# Altium footprint library hphonglib.PcbLib: 1250 footprints (part 62 of 79)
Each footprint in its own frame and in the unit in brackets; x right, y up, seen from the top. Pads: shape width x height; smd on the part's side, far side on the other; paste and mask are expansions set on the pad; w line width, h text height; cw(c..) or ccw(c..) is an arc to the next point about the centre after c.
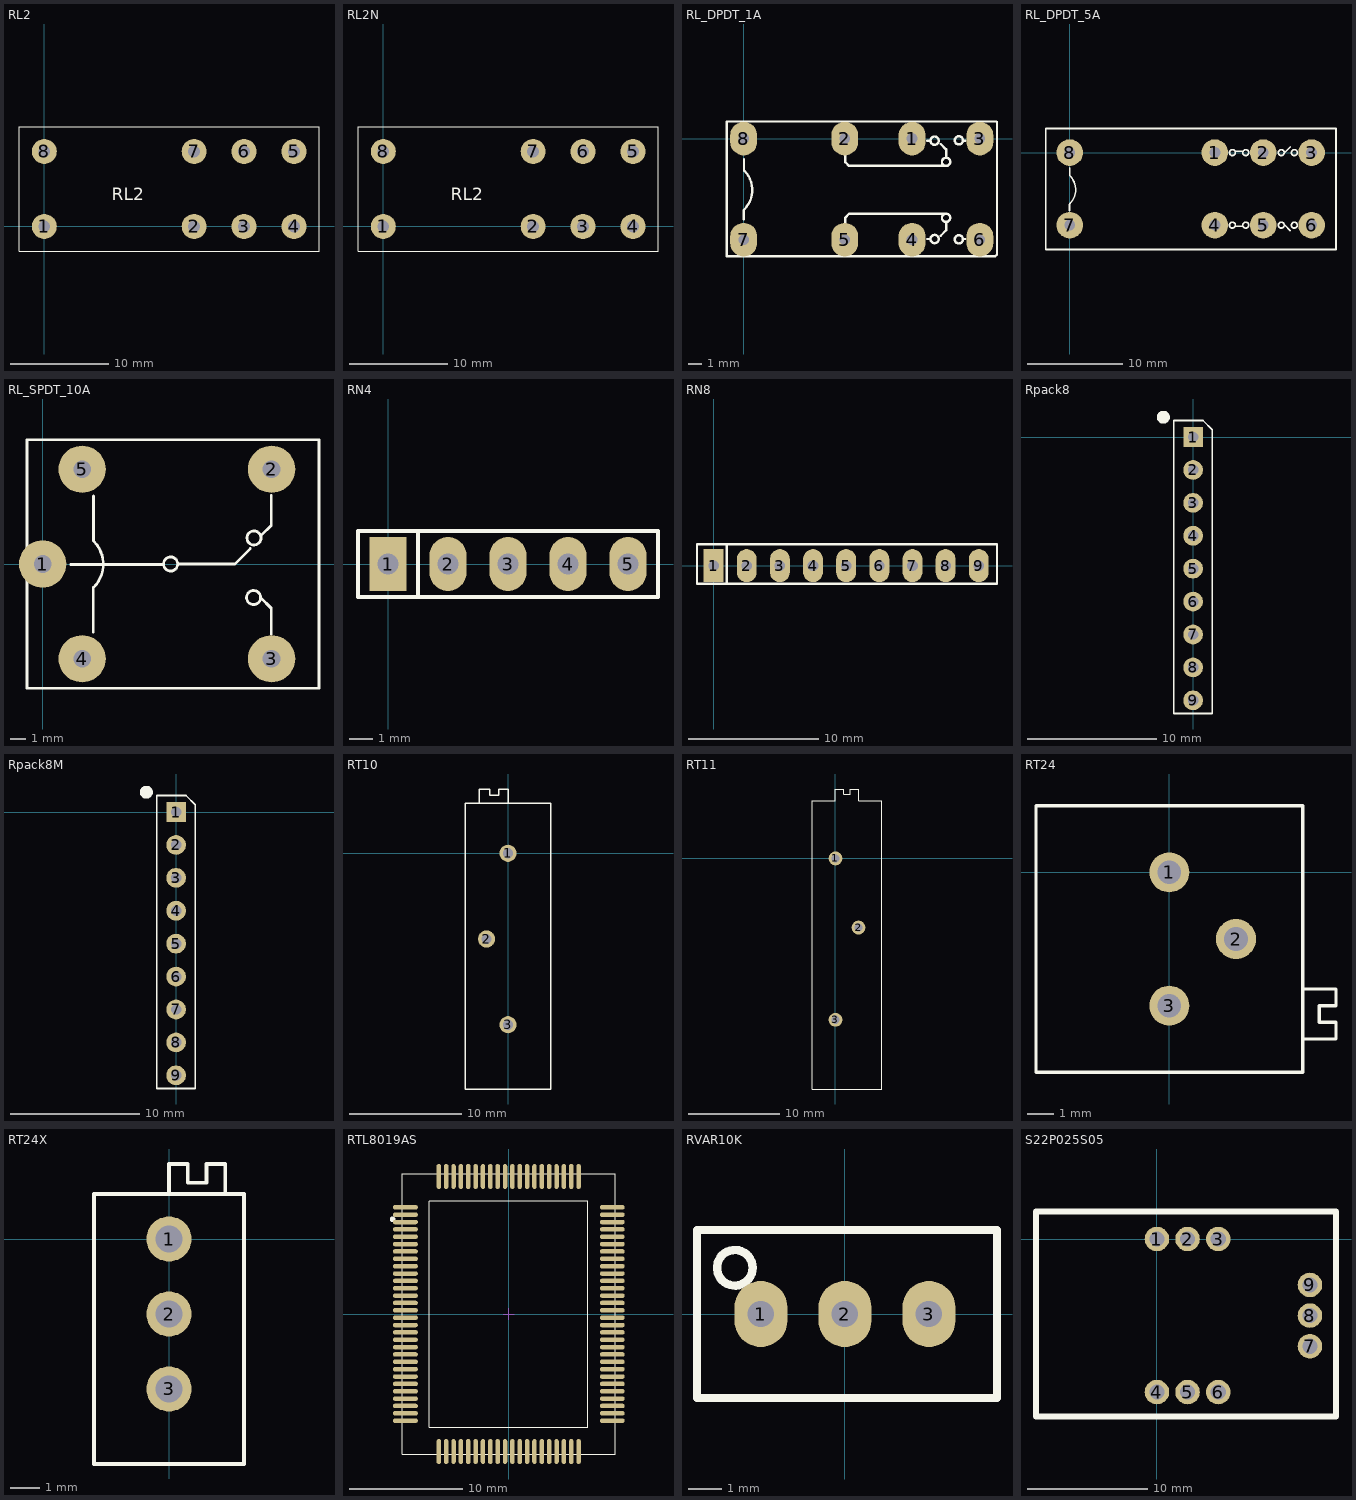
[diagram p61: the footprints below, top view; thin cyan lines are the x and y axes]

## RL2 [mm] "Relè body 29x12mm - 2 way - FEME"
pads (8):
  round 2.54 hole 1.2: 1(0,0) 2(15.24,0) 3(20.32,0) 4(25.4,0) 5(25.4,7.62) 6(20.32,7.62) 7(15.24,7.62) 8(0,7.62)
Top Overlay:
  lines w0.127: -2.54,-2.54 -2.54,10.16 27.94,10.16 27.94,-2.54 -2.54,-2.54
  text "RL2" at 6.858,2.667 h1.27
Bottom Overlay:
  lines w0.254: -2.575,-2.55 27.925,-2.55 27.925,10.125 -2.575,10.125 -2.575,-2.55
3D body: height 22, standoff 0.1, extent -2.45,-2.45 27.9,10.1

## RL2N [mm] "Relè body 29x12mm - 2 way - FEME"
pads (8):
  round 2.54 hole 1.2: 1(0,0) 2(15.24,0) 3(20.32,0) 4(25.4,0) 5(25.4,7.62) 6(20.32,7.62) 7(15.24,7.62) 8(0,7.62)
Top Overlay:
  lines w0.127: -2.54,-2.54 -2.54,10.16 27.94,10.16 27.94,-2.54 -2.54,-2.54
  text "RL2" at 6.858,2.667 h1.27
Bottom Overlay:
  lines w0.254: -2.575,-2.55 27.925,-2.55 27.925,10.125 -2.575,10.125 -2.575,-2.55
3D body "Relay.STEP": height 20.9, standoff -3.99, extent -1.941,-2.465 27.559,10.035

## RL_DPDT_1A [mil] "Reley DPDT, 8 pin, 1A, W400mil, L800mil,H 300mil"
height 300
pads (8):
  oval 80x100 hole 32: 1(500,0) 2(300,0) 3(701,0) 4(500,-300) 5(300,-300) 6(701,-300) 7(0,-300) 8(0,0)
Top Overlay:
  circle w7: c638.76,-299 r12.24
  circle w7: c566.76,-298 r12.24
  circle w7: c600.76,-235 r12.24
  circle w7: c600.76,-69 r12.24
  circle w7: c566.76,-6 r12.24
  circle w7: c638.76,-5 r12.24
  lines w7: 0,-239 0,-212 ; 1,-211 ccw(c-56.5,-152.5) 2,-95 ; 1,-94 1,-61 ; 302,-255 302,-234 313,-223 599,-223 ; 302,-42 302,-70 313,-81 599,-81 ; 544,-298 552,-298 ; 544,-6 552,-6 ; 585,-288 601,-272 601,-249 ; 585,-16 601,-32 601,-55 ; 653,-298 658,-298 ; 653,-6 658,-6 ; -50,-349 -50,51 750,51 752,49 752,-344 747,-349 -50,-349
3D body "SW3dPS-DSY2Y.STEP": height 484.25, standoff -118.11, extent -59.45,-340 759.45,45.83

## RL_DPDT_5A [mil] "Reley DPDT, 8 pin, 5A, W500mil, L1100mil,H 950mil"
height 300
pads (8):
  round 110 hole 45: 1(600,0) 2(800,0) 3(1000,0) 4(600,-300) 5(800,-300) 6(1000,-300) 7(0,-300) 8(0,0)
Top Overlay:
  circle w7: c928.76,-300 r12.24
  circle w7: c874.76,-300 r12.24
  circle w7: c727.76,-300 r12.24
  circle w7: c672.76,-300 r12.24
  circle w7: c672.76,0 r12.24
  circle w7: c727.76,0 r12.24
  circle w7: c874.76,0 r12.24
  circle w7: c928.76,0 r12.24
  lines w7: -1,-240 -1,-213 ; 0,-212 ccw(c-57.5,-153.5) 1,-96 ; 0,-95 0,-62 ; 687,-305 716,-305 ; 687,5 716,5 ; 888,-299 912,-323 ; 888,-1 912,23 ; -99,-401 1101,-401 1101,100 -99,100 -99,-401

## RL_SPDT_10A [mil] "Relay SPDT, 5 pin, 10A,W 650mil, L 800mil, H 800mil"
height 800
pads (5):
  round 120 hole 45: 1(0,0) 2(580,240) 3(580,-240) 4(100,-240) 5(100,240)
Top Overlay:
  circle w7: c324.2,0 r17.8
  circle w7: c535.2,66 r17.8
  circle w7: c534.2,-85 r17.8
  lines w7: 71,-1 304,-1 ; 128,-173 128,-60 ; 129,-59 ccw(c71.5,-0.5) 130,57 ; 129,58 129,172 ; 344,0 487,0 526,39 ; 552,-85 579,-112 579,-178 ; 553,72 579,98 579,174 ; -40,-315 700,-315 700,315 -40,315 -40,-315

## RN4 [mil] "R SIP4, 5 Pin"
height 200
pads (5):
  rect 62x90 hole 35: 1(0,0)
  oval 62x90 hole 35: 2(100,0) 3(200,0) 4(300,0) 5(400,0)
Top Overlay:
  lines w7: 50,-55 50,55 ; -50,-55 450,-55 450,55 -50,55 -50,-55

## RN8 [mil] "R SIP8, 9 Pin"
height 200
pads (9):
  rect 60x100 hole 32: 1(0,0)
  oval 60x100 hole 32: 2(100,0) 3(200,0) 4(300,0) 5(400,0) 6(500,0) 7(600,0) 8(700,0) 9(800,0)
Top Overlay:
  lines w7: 40,-55 40,65 ; -50,-55 855,-55 855,65 -50,65 -50,-55
3D body "SW3dPS-Resistor Networks-1.STEP": height 259.29, standoff -75.35, extent -42.91,-44.21 842.91,5

## Rpack8 [mil]
pads (9):
  rect 60x60 hole 31.5 unplated: 1(0,0)
  round 60 hole 31.5 unplated: 2(0,-100) 3(0,-200) 4(0,-300) 5(0,-400) 6(0,-500) 7(0,-600) 8(0,-700) 9(0,-800)
Top Overlay:
  circle w19.68: c-90.55,60.04 r9.84
  lines w5: -59.06,-840 -59.06,50 30,50 58.07,21.93 58.07,-840 -59.06,-840
Bottom Overlay:
  circle w19.68: c-91.54,57.09 r9.84
  lines w10: -57.09,-841.54 -57.09,50.2 58.07,50.2 58.07,-841.54 -57.09,-841.54
3D body: height 137.8, standoff 0.39, extent -5,-9.84 4.84,9.84
3D body: height 39.37, standoff 0.39, extent -5.5,-29.53 4.51,29.53
3D body: height 39.37, standoff 0.39, extent -5.5,-129.53 4.51,-70.47
3D body: height 137.8, standoff 0.39, extent -5,-109.84 4.84,-90.16
3D body: height 39.37, standoff 0.39, extent -5.5,-229.53 4.51,-170.47
3D body: height 137.8, standoff 0.39, extent -5,-209.84 4.84,-190.16
3D body: height 39.37, standoff 0.39, extent -5.5,-329.53 4.51,-270.47
3D body: height 137.8, standoff 0.39, extent -5,-309.84 4.84,-290.16
3D body: height 39.37, standoff 0.39, extent -5.5,-429.53 4.51,-370.47
3D body: height 137.8, standoff 0.39, extent -5,-409.84 4.84,-390.16
3D body: height 39.37, standoff 0.39, extent -5.5,-529.53 4.51,-470.47
3D body: height 137.8, standoff 0.39, extent -5,-509.84 4.84,-490.16
3D body: height 39.37, standoff 0.39, extent -5.5,-629.53 4.51,-570.47
3D body: height 137.8, standoff 0.39, extent -5,-609.84 4.84,-590.16
3D body: height 39.37, standoff 0.39, extent -5.5,-729.53 4.51,-670.47
3D body: height 137.8, standoff 0.39, extent -5,-709.84 4.84,-690.16
3D body: height 39.37, standoff 0.39, extent -5.5,-829.53 4.51,-770.47
3D body: height 137.8, standoff 0.39, extent -5,-809.84 4.84,-790.16
3D body: height 200.79, standoff 39.37, extent -49.21,-840 48.36,39.37

## Rpack8M [mil]
pads (9):
  rect 60x60 hole 31.5 unplated: 1(0,0)
  round 60 hole 31.5 unplated: 2(0,-100) 3(0,-200) 4(0,-300) 5(0,-400) 6(0,-500) 7(0,-600) 8(0,-700) 9(0,-800)
Top Overlay:
  circle w19.68: c-90.55,60.04 r9.84
  lines w5: -59.06,-840 -59.06,50 30,50 58.07,21.93 58.07,-840 -59.06,-840
Bottom Overlay:
  circle w19.68: c-91.54,57.09 r9.84
  lines w10: -57.09,-841.54 -57.09,50.2 58.07,50.2 58.07,-841.54 -57.09,-841.54
3D body "R pack.STEP": height 248.03, standoff -86.61, extent -24.61,-844.83 24.61,41

## RT10 [mil]
pads (3):
  round 60 hole 35.43 unplated: 1(0,0) 2(-75,-300) 3(0,-600)
Top Overlay:
  lines w5: -100,175 -100,225 -64,225 -64,203 -32,203 -32,225 0,225 0,175 ; -150,-825 -150,175 150,175 150,-825 -150,-825

## RT11 [mil]
pads (3):
  round 60 hole 35.43 unplated: 1(0,0) 2(100,-300) 3(0,-700)
Top Overlay:
  lines w5: 0,300 0,250 -100,250 -100,-1000 200,-1000 200,250 100,250 100,300 64,300 64,279 36,279 36,301 0,301

## RT24 [mil]
pads (3):
  round 60 hole 35.43 unplated: 1(0,0) 2(100,-100) 3(0,-200)
Top Overlay:
  lines w5: 200,-250 250,-250 250,-225 225,-225 225,-200 250,-200 250,-175 200,-175 ; -200,-300 -200,100 200,100 200,-300 -200,-300

## RT24X [mil]
pads (3):
  round 60 hole 35.43 unplated: 1(0,0) 2(0,-100) 3(0,-200)
Top Overlay:
  lines w5: 0,60 0,100 25,100 25,75 50,75 50,100 75,100 75,60 ; -100,-300 100,-300 100,60 -100,60 -100,-300

## RTL8019AS [mm] "100-Pin Ceramic Quad Flat Pack 0.635 mm Pitch, IPC Medium Density"
height 3.2
pads (100):
  oval 2.2x0.4 smd: 1(-9.125,9.425) 2(-9.125,8.775) 3(-9.125,8.125) 4(-9.125,7.475) 5(-9.125,6.825) 6(-9.125,6.175) 7(-9.125,5.525) 8(-9.125,4.875) 9(-9.125,4.225) 10(-9.125,3.575) 11(-9.125,2.925) 12(-9.125,2.275) 13(-9.125,1.625) 14(-9.125,0.975) 15(-9.125,0.325) 16(-9.125,-0.325) 17(-9.125,-0.975) 18(-9.125,-1.625) 19(-9.125,-2.275) 20(-9.125,-2.925) 21(-9.125,-3.575) 22(-9.125,-4.225) 23(-9.125,-4.875) 24(-9.125,-5.525) 25(-9.125,-6.175) 26(-9.125,-6.825) 27(-9.125,-7.475) 28(-9.125,-8.125) 29(-9.125,-8.775) 30(-9.125,-9.425) 51(9.15,-9.425) 52(9.15,-8.775) 53(9.15,-8.125) 54(9.15,-7.475) 55(9.15,-6.825) 56(9.15,-6.175) 57(9.15,-5.525) 58(9.15,-4.875) 59(9.15,-4.225) 60(9.15,-3.575) 61(9.15,-2.925) 62(9.15,-2.275) 63(9.15,-1.625) 64(9.15,-0.975) 65(9.15,-0.325) 66(9.15,0.325) 67(9.15,0.975) 68(9.15,1.625) 69(9.15,2.275) 70(9.15,2.925) 71(9.15,3.575) 72(9.15,4.225) 73(9.15,4.875) 74(9.15,5.525) 75(9.15,6.175) 76(9.15,6.825) 77(9.15,7.475) 78(9.15,8.125) 79(9.15,8.775) 80(9.15,9.425)
  oval 0.4x2.2 smd: 31(-6.175,-12.15) 32(-5.525,-12.15) 33(-4.875,-12.15) 34(-4.225,-12.15) 35(-3.575,-12.15) 36(-2.925,-12.15) 37(-2.275,-12.15) 38(-1.625,-12.15) 39(-0.975,-12.15) 40(-0.325,-12.15) 41(0.325,-12.15) 42(0.975,-12.15) 43(1.625,-12.15) 44(2.275,-12.15) 45(2.925,-12.15) 46(3.575,-12.15) 47(4.225,-12.15) 48(4.875,-12.15) 49(5.525,-12.15) 50(6.175,-12.15) 81(6.175,12.15) 82(5.525,12.15) 83(4.875,12.15) 84(4.225,12.15) 85(3.575,12.15) 86(2.925,12.15) 87(2.275,12.15) 88(1.625,12.15) 89(0.975,12.15) 90(0.325,12.15) 91(-0.325,12.15) 92(-0.975,12.15) 93(-1.625,12.15) 94(-2.275,12.15) 95(-2.925,12.15) 96(-3.575,12.15) 97(-4.225,12.15) 98(-4.875,12.15) 99(-5.525,12.15) 100(-6.175,12.15)
Top Overlay:
  circle w0.25: c-10.25,8.37 r0.125
  lines w0.1: -7,9.967 -7,-10 7,-10 7,9.967 ; -7,10 7,10 ; -9.4,-12.4 -9.4,12.4 9.4,12.4 9.4,-12.4 -9.4,-12.4
Mechanical 15:
  lines w0.1: -0.5,0 0.5,0 ; 0,-0.5 0,0.5
3D body: height 3, standoff 0, extent -7,-10 7,10

## RVAR10K [mm] "Bien tro vi chinh"
pads (3):
  oval 1.6x2 hole 0.8: 1(-2.54,0) 2(0,0) 3(2.54,0)
Top Overlay:
  circle w0.254: c-3.327,1.397 r0.539
  lines w0.254: -4.47,-2.54 -4.47,2.54 4.597,2.54 4.597,-2.54 -4.47,-2.54
3D body "User Library-Potenciometro Vertical.step": height 12.02, standoff -5.48, extent -4.537,-2.4 4.663,2.4

## S22P025S05 [mil] "Tamura"
pads (9):
  round 80 hole 50: 1(0,0) 2(100,0) 3(200,0) 4(0,-500) 5(100,-500) 6(200,-500) 7(500,-350) 8(500,-250) 9(500,-150)
Top Overlay:
  lines w20: 585,85 585,-580 -395,-580 -395,90 585,90